# Altium footprint library Reflow3D1411sep.PcbLib: 657 footprints (part 39 of 42)
Each footprint in its own frame and in the unit in brackets; x right, y up, seen from the top. Pads: shape width x height; smd on the part's side, far side on the other; paste and mask are expansions set on the pad; w line width, h text height; cw(c..) or ccw(c..) is an arc to the next point about the centre after c.
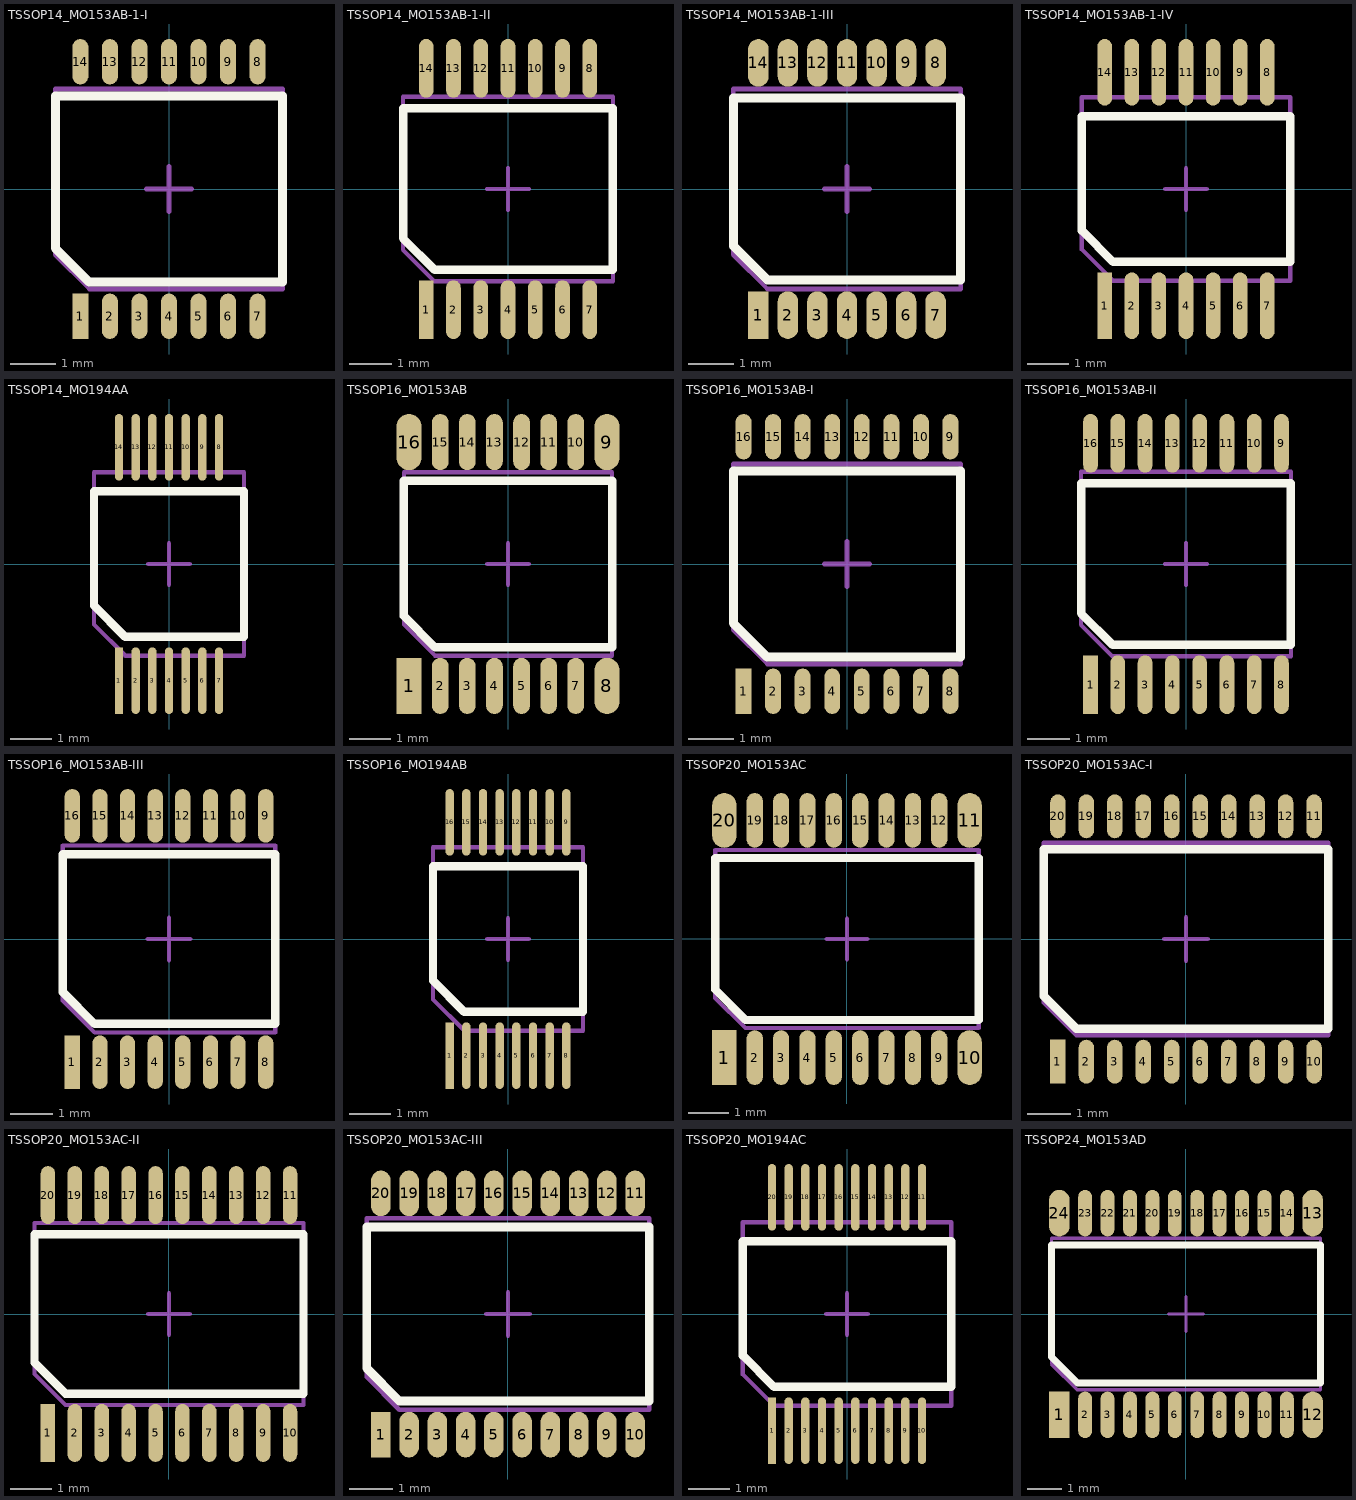
[diagram p38: the footprints below, top view; thin cyan lines are the x and y axes]

## TSSOP14_MO153AB-1-I [mm] "www.analog.com, 36057385283879153717235186773RU14.pdf, ru-14.pdf; www.jedec.org, MO-153f.pdf"
height 1.1
pads (14):
  rect 0.35x1 smd mask+0.075: 1(-1.95,-2.8)
  oval 0.35x1 smd mask+0.075: 2(-1.3,-2.8) 3(-0.65,-2.8) 4(0,-2.8) 5(0.65,-2.8) 6(1.3,-2.8) 7(1.95,-2.8) 8(1.95,2.8) 9(1.3,2.8) 10(0.65,2.8) 11(0,2.8) 12(-0.65,2.8) 13(-1.3,2.8) 14(-1.95,2.8)
Top Overlay:
  lines w0.2: -2.5,-1.3 -1.75,-2.05 2.5,-2.05 2.5,2.05 -2.5,2.05 -2.5,-1.3
Mechanical 13:
  lines w0.1: -2.5,-1.45 -2.5,2.2 2.5,2.2 2.5,-2.2 -1.75,-2.2 -2.5,-1.45
Mechanical 15:
  lines w0.1: -0.5,0 0.5,0 ; 0,-0.5 0,0.5
3D body: height 1.2, standoff 0, extent -2.55,-2.25 2.55,2.25

## TSSOP14_MO153AB-1-II [mm] "www.maxim-ic.com, 21-0066.PDF, 90-0113.PDF"
height 1
pads (14):
  rect 0.35x1.4 smd mask+0.075: 1(-1.95,-2.875)
  oval 0.35x1.4 smd mask+0.075: 2(-1.3,-2.875) 3(-0.65,-2.875) 4(0,-2.875) 5(0.65,-2.875) 6(1.3,-2.875) 7(1.95,-2.875) 8(1.95,2.875) 9(1.3,2.875) 10(0.65,2.875) 11(0,2.875) 12(-0.65,2.875) 13(-1.3,2.875) 14(-1.95,2.875)
Top Overlay:
  lines w0.2: -2.5,-1.175 -2.5,1.925 2.5,1.925 2.5,-1.925 -1.75,-1.925 -2.5,-1.175
Mechanical 13:
  lines w0.1: -2.5,-1.45 -1.75,-2.2 2.5,-2.2 2.5,2.2 -2.5,2.2 -2.5,-1.45
Mechanical 15:
  lines w0.1: -0.5,0 0.5,0 ; 0,-0.5 0,0.5
3D body: height 1.1, standoff 0, extent -2.55,-2.25 2.55,2.25

## TSSOP14_MO153AB-1-III [mm] "www.linear.com, TSSOP_14_05-08-1650.pdf"
height 1
pads (14):
  rect 0.45x1.05 smd mask+0.05: 1(-1.95,-2.775)
  oval 0.45x1.05 smd mask+0.05: 2(-1.3,-2.775) 3(-0.65,-2.775) 4(0,-2.775) 5(0.65,-2.775) 6(1.3,-2.775) 7(1.95,-2.775) 8(1.95,2.775) 9(1.3,2.775) 10(0.65,2.775) 11(0,2.775) 12(-0.65,2.775) 13(-1.3,2.775) 14(-1.95,2.775)
Top Overlay:
  lines w0.2: -2.5,-1.25 -2.5,2 2.5,2 2.5,-2 -1.75,-2 -2.5,-1.25
Mechanical 13:
  lines w0.1: -2.5,-1.45 -2.5,2.2 2.5,2.2 2.5,-2.2 -1.75,-2.2 -2.5,-1.45
Mechanical 15:
  lines w0.1: -0.5,0 0.5,0 ; 0,-0.5 0,0.5
3D body: height 1.1, standoff 0, extent -2.55,-2.25 2.55,2.25

## TSSOP14_MO153AB-1-IV [mm] "www.ti.com, tlv3492.pdf"
height 1.1
pads (14):
  rect 0.35x1.6 smd mask+0.075: 1(-1.95,-2.8)
  oval 0.35x1.6 smd mask+0.075: 2(-1.3,-2.8) 3(-0.65,-2.8) 4(0,-2.8) 5(0.65,-2.8) 6(1.3,-2.8) 7(1.95,-2.8) 8(1.95,2.8) 9(1.3,2.8) 10(0.65,2.8) 11(0,2.8) 12(-0.65,2.8) 13(-1.3,2.8) 14(-1.95,2.8)
Top Overlay:
  lines w0.2: -2.5,-1 -1.75,-1.75 2.5,-1.75 2.5,1.75 -2.5,1.75 -2.5,-1
Mechanical 13:
  lines w0.1: -2.5,-1.45 -2.5,2.2 2.5,2.2 2.5,-2.2 -1.75,-2.2 -2.5,-1.45
Mechanical 15:
  lines w0.1: -0.5,0 0.5,0 ; 0,-0.5 0,0.5
3D body: height 1.2, standoff 0, extent -2.55,-2.25 2.55,2.25

## TSSOP14_MO194AA [mm] "www.ti.com, mpds006c.pdf, DGV14.asc"
height 1.1
pads (14):
  rect 0.2x1.6 smd mask+0.05: 1(-1.2,-2.8)
  oval 0.2x1.6 smd mask+0.05: 2(-0.8,-2.8) 3(-0.4,-2.8) 4(0,-2.8) 5(0.4,-2.8) 6(0.8,-2.8) 7(1.2,-2.8) 8(1.2,2.8) 9(0.8,2.8) 10(0.4,2.8) 11(0,2.8) 12(-0.4,2.8) 13(-0.8,2.8) 14(-1.2,2.8)
Top Overlay:
  lines w0.2: -1.8,-1 -1.8,1.75 1.8,1.75 1.8,-1.75 -1.05,-1.75 -1.8,-1
Mechanical 13:
  lines w0.1: -1.8,-1.45 -1.05,-2.2 1.8,-2.2 1.8,2.2 -1.8,2.2 -1.8,-1.45
Mechanical 15:
  lines w0.1: -0.5,0 0.5,0 ; 0,-0.5 0,0.5
3D body: height 1.2, standoff 0, extent -1.85,-2.25 1.85,2.25

## TSSOP16_MO153AB [mm] "www.nxp.com, sot403-1_po.pdf, sot403-1_fr.pdf"
height 0.98
pads (16):
  rect 0.6x1.35 smd mask+0.05: 1(-2.375,-2.925)
  oval 0.4x1.35 smd mask+0.05: 2(-1.625,-2.925) 3(-0.975,-2.925) 4(-0.325,-2.925) 5(0.325,-2.925) 6(0.975,-2.925) 7(1.625,-2.925) 10(1.625,2.925) 11(0.975,2.925) 12(0.325,2.925) 13(-0.325,2.925) 14(-0.975,2.925) 15(-1.625,2.925)
  oval 0.6x1.35 smd mask+0.05: 8(2.375,-2.925) 9(2.375,2.925) 16(-2.375,2.925)
Top Overlay:
  lines w0.2: -2.5,-1.25 -1.75,-2 2.5,-2 2.5,2 -2.5,2 -2.5,-1.25
Mechanical 13:
  lines w0.1: -2.5,-1.45 -2.5,2.2 2.5,2.2 2.5,-2.2 -1.75,-2.2 -2.5,-1.45
Mechanical 15:
  lines w0.1: -0.5,0 0.5,0 ; 0,-0.5 0,0.5
3D body: height 1.1, standoff 0, extent -2.55,-2.25 2.55,2.25

## TSSOP16_MO153AB-I [mm] "www.analog.com, 36244347913743854010197452789RU16.pdf, ru-16.pdf; www.jedec.org, MO-153f.pdf"
height 1.1
pads (16):
  rect 0.35x1 smd mask+0.075: 1(-2.275,-2.8)
  oval 0.35x1 smd mask+0.075: 2(-1.625,-2.8) 3(-0.975,-2.8) 4(-0.325,-2.8) 5(0.325,-2.8) 6(0.975,-2.8) 7(1.625,-2.8) 8(2.275,-2.8) 9(2.275,2.8) 10(1.625,2.8) 11(0.975,2.8) 12(0.325,2.8) 13(-0.325,2.8) 14(-0.975,2.8) 15(-1.625,2.8) 16(-2.275,2.8)
Top Overlay:
  lines w0.2: -2.5,-1.3 -2.5,2.05 2.5,2.05 2.5,-2.05 -1.75,-2.05 -2.5,-1.3
Mechanical 13:
  lines w0.1: -2.5,-1.45 -1.75,-2.2 2.5,-2.2 2.5,2.2 -2.5,2.2 -2.5,-1.45
Mechanical 15:
  lines w0.1: -0.5,0 0.5,0 ; 0,-0.5 0,0.5
3D body: height 1.2, standoff 0, extent -2.55,-2.25 2.55,2.25

## TSSOP16_MO153AB-II [mm] "www.maxim-ic.com, 21-0066.PDF, 90-0117.PDF"
height 1
pads (16):
  rect 0.35x1.4 smd mask+0.075: 1(-2.275,-2.875)
  oval 0.35x1.4 smd mask+0.075: 2(-1.625,-2.875) 3(-0.975,-2.875) 4(-0.325,-2.875) 5(0.325,-2.875) 6(0.975,-2.875) 7(1.625,-2.875) 8(2.275,-2.875) 9(2.275,2.875) 10(1.625,2.875) 11(0.975,2.875) 12(0.325,2.875) 13(-0.325,2.875) 14(-0.975,2.875) 15(-1.625,2.875) 16(-2.275,2.875)
Top Overlay:
  lines w0.2: -2.5,-1.175 -2.5,1.925 2.5,1.925 2.5,-1.925 -1.75,-1.925 -2.5,-1.175
Mechanical 13:
  lines w0.1: -2.5,-1.45 -2.5,2.2 2.5,2.2 2.5,-2.2 -1.75,-2.2 -2.5,-1.45
Mechanical 15:
  lines w0.1: -0.5,0 0.5,0 ; 0,-0.5 0,0.5
3D body: height 1.1, standoff 0, extent -2.55,-2.25 2.55,2.25

## TSSOP16_MO153AB-III [mm] "www.onsemi.com, 419AG.PDF; www.jedec.org, MO-153f.pdf"
height 1.1
pads (16):
  rect 0.36x1.26 smd mask+0.075: 1(-2.275,-2.9)
  oval 0.36x1.26 smd mask+0.075: 2(-1.625,-2.9) 3(-0.975,-2.9) 4(-0.325,-2.9) 5(0.325,-2.9) 6(0.975,-2.9) 7(1.625,-2.9) 8(2.275,-2.9) 9(2.275,2.9) 10(1.625,2.9) 11(0.975,2.9) 12(0.325,2.9) 13(-0.325,2.9) 14(-0.975,2.9) 15(-1.625,2.9) 16(-2.275,2.9)
Top Overlay:
  lines w0.2: -2.5,-1.25 -2.5,2 2.5,2 2.5,-2 -1.75,-2 -2.5,-1.25
Mechanical 13:
  lines w0.1: -2.5,-1.45 -1.75,-2.2 2.5,-2.2 2.5,2.2 -2.5,2.2 -2.5,-1.45
Mechanical 15:
  lines w0.1: -0.5,0 0.5,0 ; 0,-0.5 0,0.5
3D body: height 1.2, standoff 0, extent -2.55,-2.25 2.55,2.25

## TSSOP16_MO194AB [mm] "www.ti.com, mpds006c.pdf, DGV16.asc"
height 1.1
pads (16):
  rect 0.2x1.6 smd mask+0.05: 1(-1.4,-2.8)
  oval 0.2x1.6 smd mask+0.05: 2(-1,-2.8) 3(-0.6,-2.8) 4(-0.2,-2.8) 5(0.2,-2.8) 6(0.6,-2.8) 7(1,-2.8) 8(1.4,-2.8) 9(1.4,2.8) 10(1,2.8) 11(0.6,2.8) 12(0.2,2.8) 13(-0.2,2.8) 14(-0.6,2.8) 15(-1,2.8) 16(-1.4,2.8)
Top Overlay:
  lines w0.2: -1.8,-1 -1.05,-1.75 1.8,-1.75 1.8,1.75 -1.8,1.75 -1.8,-1
Mechanical 13:
  lines w0.1: -1.8,-1.45 -1.8,2.2 1.8,2.2 1.8,-2.2 -1.05,-2.2 -1.8,-1.45
Mechanical 15:
  lines w0.1: -0.5,0 0.5,0 ; 0,-0.5 0,0.5
3D body: height 1.2, standoff 0, extent -1.85,-2.25 1.85,2.25

## TSSOP20_MO153AC [mm] "www.nxp.com, sot360-1_po.pdf, sot360-1_fr.pdf"
height 0.98
pads (20):
  rect 0.6x1.35 smd mask+0.05: 1(-3.025,-2.925)
  oval 0.4x1.35 smd mask+0.05: 2(-2.275,-2.925) 3(-1.625,-2.925) 4(-0.975,-2.925) 5(-0.325,-2.925) 6(0.325,-2.925) 7(0.975,-2.925) 8(1.625,-2.925) 9(2.275,-2.925) 12(2.275,2.925) 13(1.625,2.925) 14(0.975,2.925) 15(0.325,2.925) 16(-0.325,2.925) 17(-0.975,2.925) 18(-1.625,2.925) 19(-2.275,2.925)
  oval 0.6x1.35 smd mask+0.05: 10(3.025,-2.925) 11(3.025,2.925) 20(-3.025,2.925)
Top Overlay:
  lines w0.2: -3.25,-1.25 -2.5,-2 3.25,-2 3.25,2 -3.25,2 -3.25,-1.25
Mechanical 13:
  lines w0.1: -3.25,-1.45 -3.25,2.2 3.25,2.2 3.25,-2.2 -2.5,-2.2 -3.25,-1.45
Mechanical 15:
  lines w0.1: -0.5,0 0.5,0 ; 0,-0.5 0,0.5
3D body: height 1.1, standoff 0, extent -3.3,-2.25 3.3,2.25

## TSSOP20_MO153AC-I [mm] "www.analog.com, 364515793657813558433715854054607941441RU20.pdf, ru-20.pdf; www.jedec.org, MO-153f.pdf"
height 1.1
pads (20):
  rect 0.35x1 smd mask+0.075: 1(-2.925,-2.8)
  oval 0.35x1 smd mask+0.075: 2(-2.275,-2.8) 3(-1.625,-2.8) 4(-0.975,-2.8) 5(-0.325,-2.8) 6(0.325,-2.8) 7(0.975,-2.8) 8(1.625,-2.8) 9(2.275,-2.8) 10(2.925,-2.8) 11(2.925,2.8) 12(2.275,2.8) 13(1.625,2.8) 14(0.975,2.8) 15(0.325,2.8) 16(-0.325,2.8) 17(-0.975,2.8) 18(-1.625,2.8) 19(-2.275,2.8) 20(-2.925,2.8)
Top Overlay:
  lines w0.2: -3.25,-1.3 -3.25,2.05 3.25,2.05 3.25,-2.05 -2.5,-2.05 -3.25,-1.3
Mechanical 13:
  lines w0.1: -3.25,-1.45 -3.25,2.2 3.25,2.2 3.25,-2.2 -2.5,-2.2 -3.25,-1.45
Mechanical 15:
  lines w0.1: -0.5,0 0.5,0 ; 0,-0.5 0,0.5
3D body: height 1.2, standoff 0, extent -3.3,-2.25 3.3,2.25

## TSSOP20_MO153AC-II [mm] "www.maxim-ic.com, 21-0066.PDF, 90-0116.PDF"
height 1
pads (20):
  rect 0.35x1.4 smd mask+0.075: 1(-2.925,-2.875)
  oval 0.35x1.4 smd mask+0.075: 2(-2.275,-2.875) 3(-1.625,-2.875) 4(-0.975,-2.875) 5(-0.325,-2.875) 6(0.325,-2.875) 7(0.975,-2.875) 8(1.625,-2.875) 9(2.275,-2.875) 10(2.925,-2.875) 11(2.925,2.875) 12(2.275,2.875) 13(1.625,2.875) 14(0.975,2.875) 15(0.325,2.875) 16(-0.325,2.875) 17(-0.975,2.875) 18(-1.625,2.875) 19(-2.275,2.875) 20(-2.925,2.875)
Top Overlay:
  lines w0.2: -3.25,-1.175 -2.5,-1.925 3.25,-1.925 3.25,1.925 -3.25,1.925 -3.25,-1.175
Mechanical 13:
  lines w0.1: -3.25,-1.45 -2.5,-2.2 3.25,-2.2 3.25,2.2 -3.25,2.2 -3.25,-1.45
Mechanical 15:
  lines w0.1: -0.5,0 0.5,0 ; 0,-0.5 0,0.5
3D body: height 1.1, standoff 0, extent -3.3,-2.25 3.3,2.25

## TSSOP20_MO153AC-III [mm] "www.linear.com, TSSOP_20_05-08-1650.pdf"
height 1
pads (20):
  rect 0.45x1.05 smd mask+0.05: 1(-2.925,-2.775)
  oval 0.45x1.05 smd mask+0.05: 2(-2.275,-2.775) 3(-1.625,-2.775) 4(-0.975,-2.775) 5(-0.325,-2.775) 6(0.325,-2.775) 7(0.975,-2.775) 8(1.625,-2.775) 9(2.275,-2.775) 10(2.925,-2.775) 11(2.925,2.775) 12(2.275,2.775) 13(1.625,2.775) 14(0.975,2.775) 15(0.325,2.775) 16(-0.325,2.775) 17(-0.975,2.775) 18(-1.625,2.775) 19(-2.275,2.775) 20(-2.925,2.775)
Top Overlay:
  lines w0.2: -3.25,-1.25 -2.5,-2 3.25,-2 3.25,2 -3.25,2 -3.25,-1.25
Mechanical 13:
  lines w0.1: -3.25,-1.45 -2.5,-2.2 3.25,-2.2 3.25,2.2 -3.25,2.2 -3.25,-1.45
Mechanical 15:
  lines w0.1: -0.5,0 0.5,0 ; 0,-0.5 0,0.5
3D body: height 1.1, standoff 0, extent -3.3,-2.25 3.3,2.25

## TSSOP20_MO194AC [mm] "www.ti.com, mpds006c.pdf, DGV20.asc, DGV24.asc"
height 1.1
pads (20):
  rect 0.2x1.6 smd mask+0.05: 1(-1.8,-2.8)
  oval 0.2x1.6 smd mask+0.05: 2(-1.4,-2.8) 3(-1,-2.8) 4(-0.6,-2.8) 5(-0.2,-2.8) 6(0.2,-2.8) 7(0.6,-2.8) 8(1,-2.8) 9(1.4,-2.8) 10(1.8,-2.8) 11(1.8,2.8) 12(1.4,2.8) 13(1,2.8) 14(0.6,2.8) 15(0.2,2.8) 16(-0.2,2.8) 17(-0.6,2.8) 18(-1,2.8) 19(-1.4,2.8) 20(-1.8,2.8)
Top Overlay:
  lines w0.2: -2.5,-1 -2.5,1.75 2.5,1.75 2.5,-1.75 -1.75,-1.75 -2.5,-1
Mechanical 13:
  lines w0.1: -2.5,-1.45 -1.75,-2.2 2.5,-2.2 2.5,2.2 -2.5,2.2 -2.5,-1.45
Mechanical 15:
  lines w0.1: -0.5,0 0.5,0 ; 0,-0.5 0,0.5
3D body: height 1.2, standoff 0, extent -2.55,-2.25 2.55,2.25

## TSSOP24_MO153AD [mm] "www.nxp.com, sot355-1_po.pdf, sot355-1_fr.pdf"
height 0.98
pads (24):
  rect 0.6x1.35 smd mask+0.05: 1(-3.675,-2.925)
  oval 0.4x1.35 smd mask+0.05: 2(-2.925,-2.925) 3(-2.275,-2.925) 4(-1.625,-2.925) 5(-0.975,-2.925) 6(-0.325,-2.925) 7(0.325,-2.925) 8(0.975,-2.925) 9(1.625,-2.925) 10(2.275,-2.925) 11(2.925,-2.925) 14(2.925,2.925) 15(2.275,2.925) 16(1.625,2.925) 17(0.975,2.925) 18(0.325,2.925) 19(-0.325,2.925) 20(-0.975,2.925) 21(-1.625,2.925) 22(-2.275,2.925) 23(-2.925,2.925)
  oval 0.6x1.35 smd mask+0.05: 12(3.675,-2.925) 13(3.675,2.925) 24(-3.675,2.925)
Top Overlay:
  lines w0.2: -3.9,-1.25 -3.9,2 3.9,2 3.9,-2 -3.15,-2 -3.9,-1.25
Mechanical 13:
  lines w0.1: -3.9,-1.45 -3.15,-2.2 3.9,-2.2 3.9,2.2 -3.9,2.2 -3.9,-1.45
Mechanical 15:
  lines w0.1: -0.5,0 0.5,0 ; 0,-0.5 0,0.5
3D body: height 1.1, standoff 0, extent -3.95,-2.25 3.95,2.25